# Altium footprint library PcbLib.PcbLib: 11 footprints
Each footprint in its own frame and in the unit in brackets; x right, y up, seen from the top. Pads: shape width x height; smd on the part's side, far side on the other; paste and mask are expansions set on the pad; w line width, h text height; cw(c..) or ccw(c..) is an arc to the next point about the centre after c.
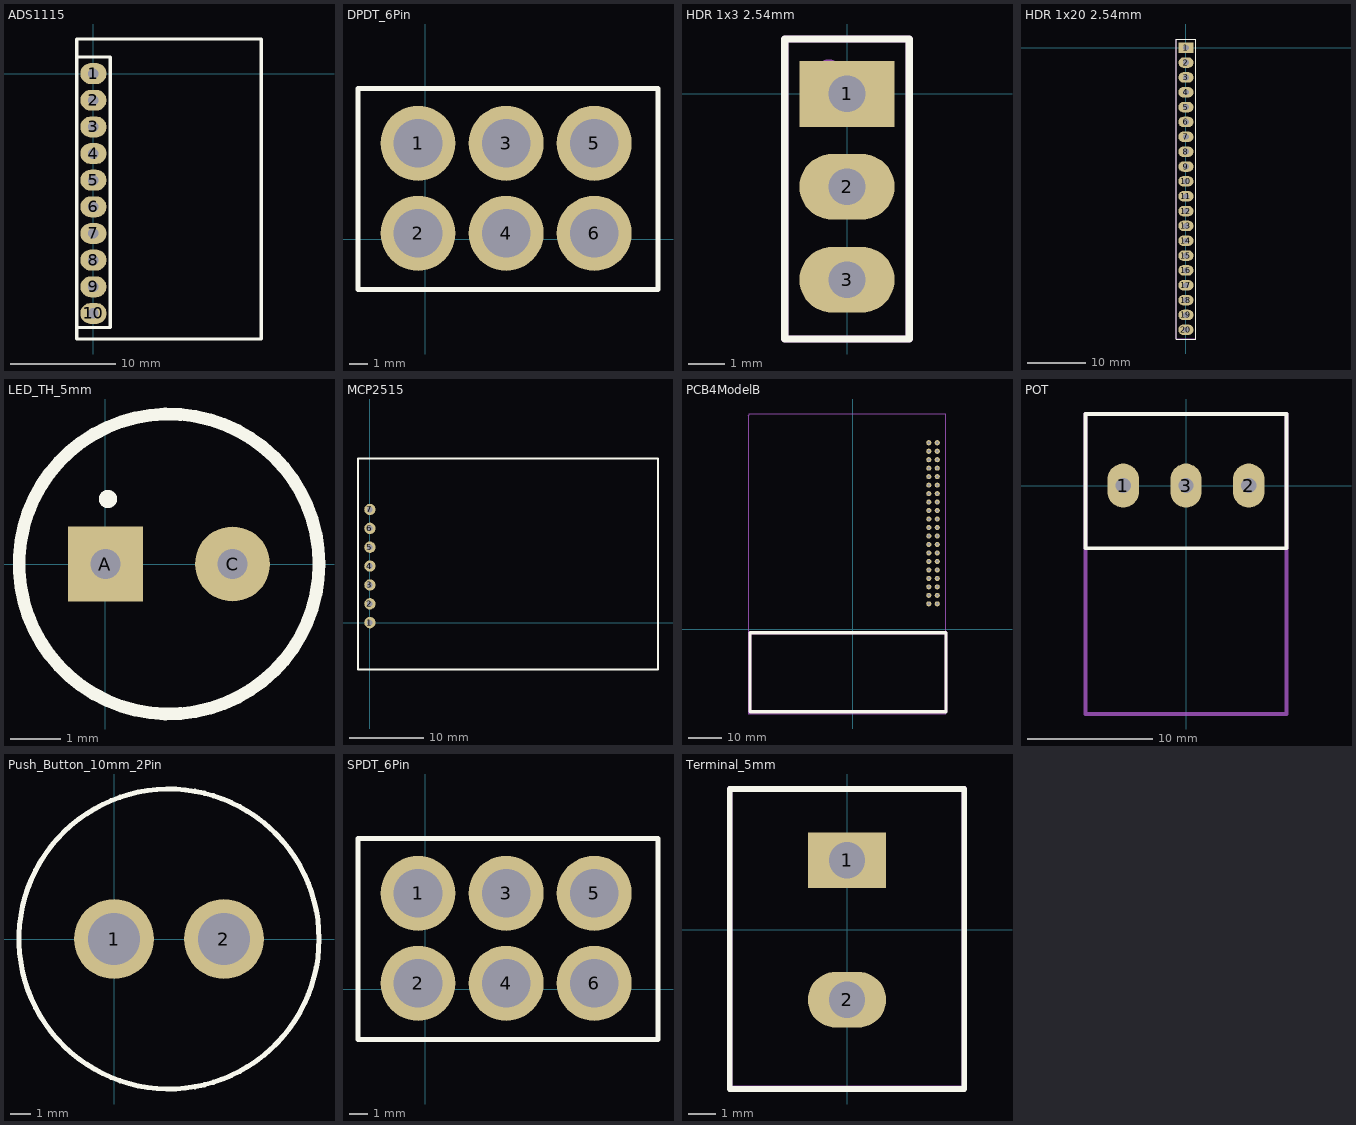
[diagram p0: the footprints below, top view; thin cyan lines are the x and y axes]

## ADS1115 [mm]
pads (10):
  oval 2.5x2 hole 1: 1(0,0) 2(0,-2.54) 3(0,-5.08) 4(0,-7.62) 5(0,-10.16) 6(0,-12.7) 7(0,-15.24) 8(0,-17.78) 9(0,-20.32) 10(0,-22.86)
Top Overlay:
  lines w0.3: -1.6,-24.2 1.6,-24.2 1.6,1.6 -1.6,1.6 ; -1.6,-24.2 -1.6,1.6 ; -1.6,-24.2 -1.6,-25.3 16,-25.3 16,3.3 -1.6,3.3 -1.6,1.6
3D body "Female 10 Pin Header.step": height 10.01, standoff -1.99, extent -1.25,-23.8 1.25,1.2
3D body "ads1015 ads1115 module type1.step": height 16, standoff 4.5, extent -1.287,-24.9 15.687,3.075

## DPDT_6Pin [mm]
pads (6):
  round 4 hole 2.6: 1(-0.375,5.125) 2(-0.375,0.325) 3(4.325,5.125) 4(4.325,0.325) 5(9.025,5.125) 6(9.025,0.325)
Top Overlay:
  lines w0.254: 12.425,-2.675 -3.575,-2.675 -3.575,8.05 12.425,8.05 12.425,-2.65
3D body "Toggle master switch 01.SLDPRT": height 19.77, standoff -4.35, extent -2.725,-4.2 11.475,10

## HDR 1x3 2.54mm [mm]
pads (3):
  rect 2.6x1.8 hole 1: 1(0,0)
  oval 2.6x1.8 hole 1: 2(0,-2.54) 3(0,-5.08)
Top Overlay:
  lines w0.2: -1.7,-6.7 1.7,-6.7 1.7,1.5 -1.7,1.5 -1.7,-6.7
Mechanical 2:
  circle w0.5: c-0.508,0.508 r0.18
  lines w0.2: -1.7,-6.7 1.7,-6.7 1.7,1.5 -1.7,1.5 -1.7,-6.7
  text ".Designator" at 0.5,-5.7 h1
3D body "TSW-103-07-F-S.stp": height 8.39, standoff -2.53, extent -1.27,-6.477 1.27,1.27

## HDR 1x20 2.54mm [mm]
pads (20):
  rect 2.6x1.8 hole 1: 1(0,0)
  oval 2.6x1.8 hole 1: 2(0,-2.54) 3(0,-5.08) 4(-0.025,-7.615) 5(-0.025,-10.155) 6(-0.025,-12.695) 7(-0.025,-15.235) 8(-0.025,-17.775) 9(-0.025,-20.315) 10(-0.025,-22.855) 11(-0.025,-25.395) 12(-0.025,-27.935) 13(-0.025,-30.475) 14(-0.025,-33.015) 15(-0.025,-35.555) 16(-0.025,-38.095) 17(-0.025,-40.635) 18(-0.025,-43.175) 19(-0.025,-45.715) 20(-0.025,-48.255)
Top Overlay:
  lines w0.2: -1.7,-49.825 -1.7,1.5 1.7,1.5 1.7,-49.825 -1.7,-49.825
Mechanical 2:
  circle w0.5: c-0.233,-42.967 r0.18
  lines w0.2: -1.7,-49.8 -1.7,1.5 1.7,1.5 1.7,-49.8 -1.7,-49.8
  text ".Designator" at 0.2,-6.525 h1
3D body "TSW-103-07-F-S.stp": height 8.39, standoff -2.53, extent -1.24,-6.373 1.3,1.373

## LED_TH_5mm [mm]
pads (2):
  rect 1.5x1.5 hole 0.6: A(0,0)
  round 1.5 hole 0.6: C(2.54,0)
Top Overlay:
  circle w0.254: c0.05,1.3 r0.056
  circle w0.254: c1.27,0 r3

## MCP2515 [mil]
pads (7):
  round 60 hole 30: 1(0,0) 2(0,100) 3(0,200) 4(0,300) 5(0,400) 6(0,500) 7(0,600)
Top Overlay:
  lines w11.81: -62.99,-248.03 1527.56,-248.03 1527.56,870.08 -62.99,870.08 -62.99,-248.03
3D body "MCP2515 Module.step": height 807.09, standoff 255.91, extent -55.12,-240.16 1519.69,862.2
3D body "Female 7 Pin Header.step": height 354.33, standoff -118.11, extent -49.21,-39.76 49.21,649.21

## PCB4ModelB [mil]
pads (40):
  round 60 hole 30: 1(900,2200) 2(1000,2200) 3(900,2100) 4(1000,2100) 5(900,2000) 6(1000,2000) 7(900,1900) 8(1000,1900) 9(900,1800) 10(1000,1800) 11(900,1700) 12(1000,1700) 13(900,1600) 14(1000,1600) 15(900,1500) 16(1000,1500) 17(900,1400) 18(1000,1400) 19(900,1300) 20(1000,1300) 21(900,1200) 22(1000,1200) 23(900,1100) 24(1000,1100) 25(900,1000) 26(1000,1000) 27(900,900) 28(1000,900) 29(900,800) 30(1000,800) 31(900,700) 32(1000,700) 33(900,600) 34(1000,600) 35(900,500) 36(1000,500) 37(900,400) 38(1000,400) 39(900,300) 40(1000,300)
Top Overlay:
  lines w39.37: -1208.66,-972.44 -1208.66,-43.31 1102.36,-43.31 1102.36,-972.44 -1208.66,-972.44
Keep-Out Layer:
  lines w39.37: -1208.66,-972.44 1102.36,-972.44 1102.36,-43.31 -1208.66,-43.31 -1208.66,-972.44
Mechanical 2:
  lines w11.81: -1232.28,-1000 -1232.28,2519.68 -1220.47,2531.5 -1220.47,2539.37 1102.36,2539.37 1102.36,-1000 -1232.28,-1000
3D body "Female 10 Pin Header.step": height 86.61, standoff -385.83, extent 950.79,250.79 1049.21,1235.04
3D body "Female 10 Pin Header.step": height 86.61, standoff -385.83, extent 850.79,250.79 949.21,1235.04
3D body "Female 10 Pin Header.step": height 86.61, standoff -385.83, extent 950.79,1250.79 1049.21,2235.04
3D body "Female 10 Pin Header.step": height 86.61, standoff -385.83, extent 850.79,1250.79 949.21,2235.04
3D body "Raspberry Pi 4 Model B.STEP": height 110.75, standoff -672.72, extent -1212.6,-975.98 1086.61,2527.56

## POT [mm]
pads (3):
  oval 2.5x3.5 hole 1.2: 1(-5,0) 2(5,0) 3(0,0)
Top Overlay:
  lines w0.3: -8,-5 8,-5 8,5.7 -8,5.7 -8,-5
Mechanical 2:
  lines w0.3: -7.9,5.7 -8,5.7 ; -8,5.7 8,5.7 8,-18.2 -8,-18.2 -8,5.7
  text ".Designator" at -7.6,3.2 h1.5
3D body "Potentiometer.step": height 21, standoff -3.5, extent -8,-18.2 8,5.8

## Push_Button_10mm_2Pin [mm]
pads (2):
  round 4 hole 2.6: 1(0,0) 2(5.5,0)
Top Overlay:
  circle w0.254: c2.75,0 r7.5
3D body "Push_main.SLDPRT": height 5.99, standoff -18.8, extent -3.207,-5.925 8.807,6.095

## SPDT_6Pin [mm]
pads (6):
  round 4 hole 2.6: 1(-0.375,5.125) 2(-0.375,0.325) 3(4.325,5.125) 4(4.325,0.325) 5(9.025,5.125) 6(9.025,0.325)
Top Overlay:
  lines w0.254: 12.425,-2.675 -3.575,-2.675 -3.575,8.05 12.425,8.05 12.425,-2.65
3D body "Toggle master switch 01.SLDPRT": height 19.77, standoff -4.35, extent -2.725,-4.2 11.475,10

## Terminal_5mm [mm]
pads (2):
  rect 2.8x2 hole 1.3: 1(0,2.5)
  oval 2.8x2 hole 1.3: 2(0,-2.5)
Top Overlay:
  lines w0.2: -4.2,-5.7 4.2,-5.7 4.2,5.05 -4.2,5.05 -4.2,-5.7
Mechanical 2:
  lines w0.2: -4.2,-5.675 4.2,-5.675 4.2,5.05 -4.2,5.05 -4.2,-5.675
  text ".Designator" at -2.45,-1.175 h3
3D body "1729018.stp": height 10.01, standoff -3.49, extent -4.075,-5.585 4.075,4.985